# Altium footprint library Footprints_SOC.PcbLib: 194 footprints (part 12 of 13)
Each footprint in its own frame and in the unit in brackets; x right, y up, seen from the top. Pads: shape width x height; smd on the part's side, far side on the other; paste and mask are expansions set on the pad; w line width, h text height; cw(c..) or ccw(c..) is an arc to the next point about the centre after c.
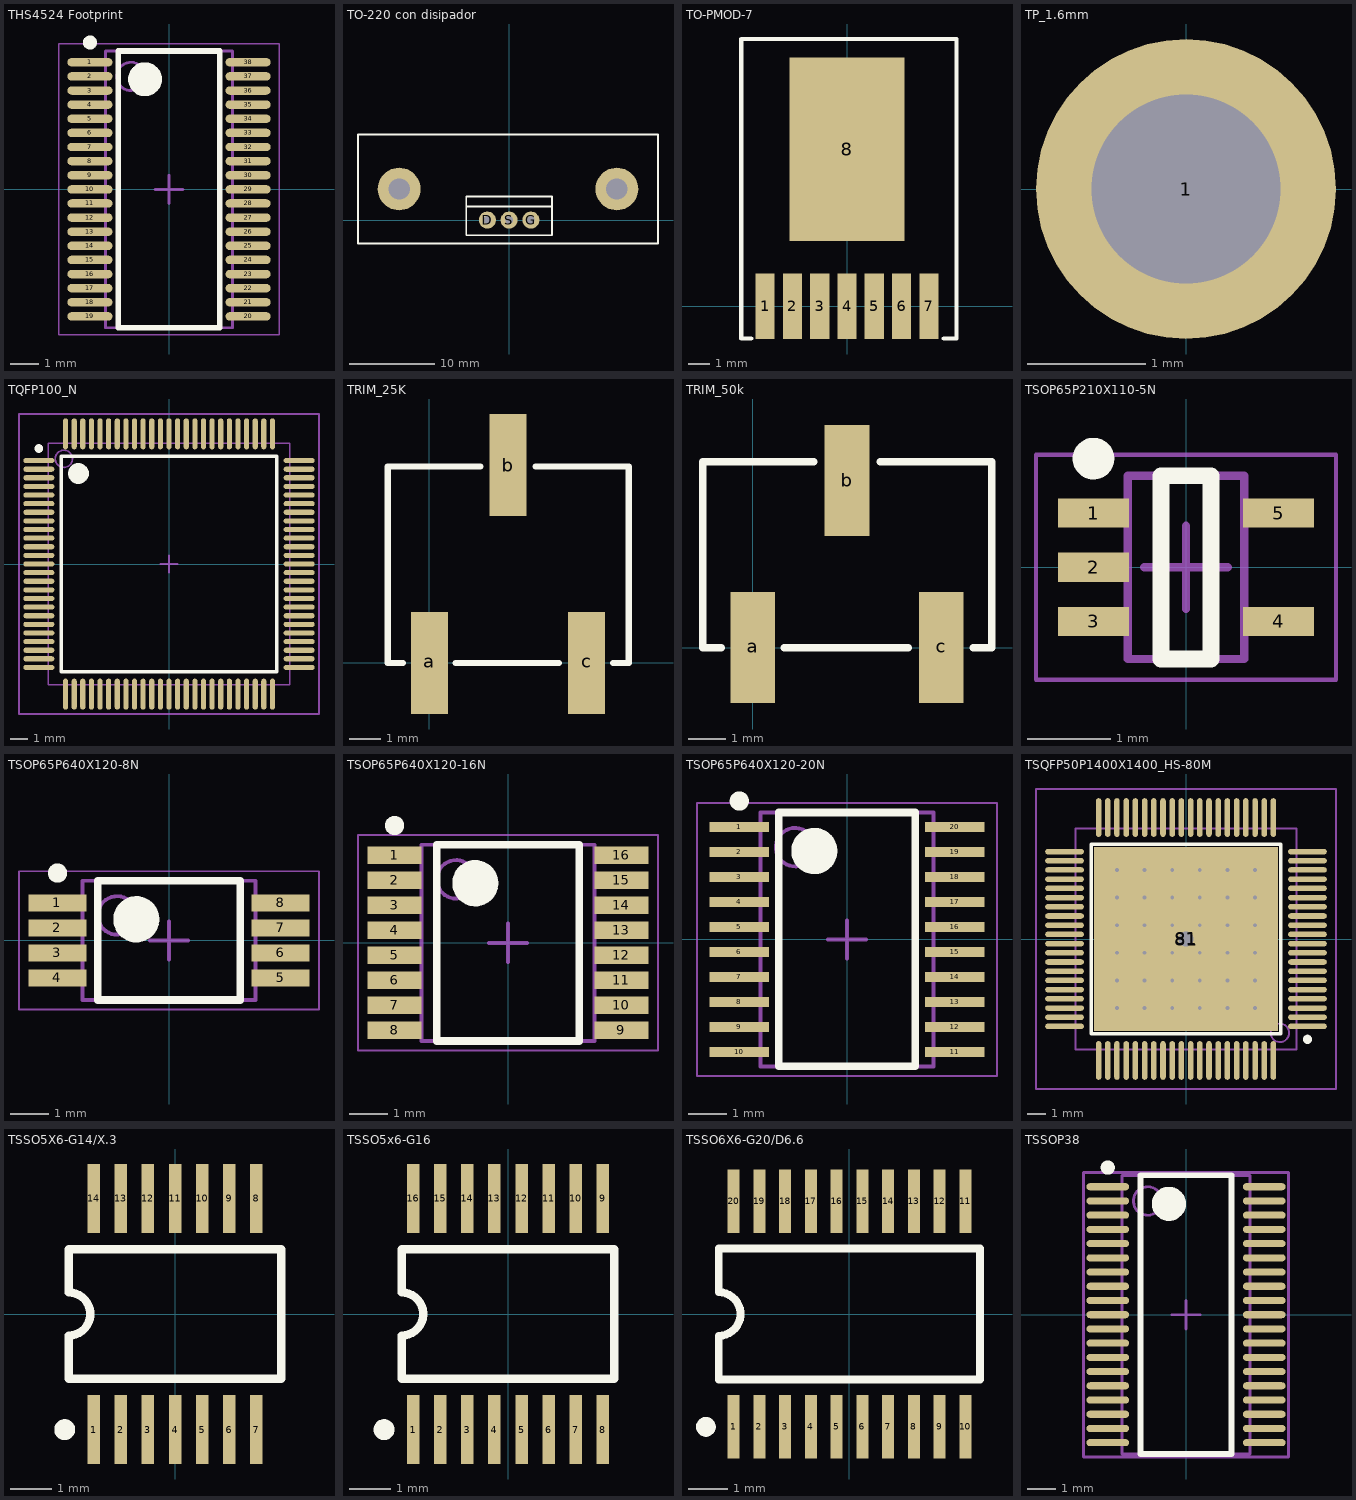
[diagram p11: the footprints below, top view; thin cyan lines are the x and y axes]

## THS4524 Footprint [mm] "THS4524 4Ch Dif Amp, TSSOP"
height 1.2
pads (38):
  oval 1.6x0.3 smd mask+0.05: 1(-2.8,4.5) 2(-2.8,4) 3(-2.8,3.5) 4(-2.8,3) 5(-2.8,2.5) 6(-2.8,2) 7(-2.8,1.5) 8(-2.8,1) 9(-2.8,0.5) 10(-2.8,0) 11(-2.8,-0.5) 12(-2.8,-1) 13(-2.8,-1.5) 14(-2.8,-2) 15(-2.8,-2.5) 16(-2.8,-3) 17(-2.8,-3.5) 18(-2.8,-4) 19(-2.8,-4.5) 20(2.8,-4.5) 21(2.8,-4) 22(2.8,-3.5) 23(2.8,-3) 24(2.8,-2.5) 25(2.8,-2) 26(2.8,-1.5) 27(2.8,-1) 28(2.8,-0.5) 29(2.8,0) 30(2.8,0.5) 31(2.8,1) 32(2.8,1.5) 33(2.8,2) 34(2.8,2.5) 35(2.8,3) 36(2.8,3.5) 37(2.8,4) 38(2.8,4.5)
Top Overlay:
  circle w0.25: c-2.8,5.2 r0.125
  circle w0.6: c-0.85,3.9 r0.3
  lines w0.2: -1.803,-4.9 -1.803,4.9 1.803,4.9 1.803,-4.9 -1.803,-4.9
Mechanical 5:
  circle w0.1: c-1.35,4 r0.5
  lines w0.1: -2.25,-4.9 2.25,-4.9 2.25,4.9 -2.25,4.9 -2.25,-4.9
  text ".Designator" at 0,0 h1.02
Mechanical 15:
  lines w0.05: -3.9,-5.15 -3.9,5.15 3.9,5.15 3.9,-5.15 -3.9,-5.15
  lines w0.1: -0.5,0 0.5,0 ; 0,-0.5 0,0.5
3D body: height 1.2, standoff 0.05, extent -2.25,-4.9 2.25,4.9

## TO-220 con disipador [mm]
pads (5):
  round 2 hole 0.9: D(-2.54,0) G(2.54,0) S(0,0)
  round 5 hole 2.5: ""(-12.829,3.625) ""(12.571,3.625)
Top Overlay:
  lines w0.2: -17.629,9.964 -17.629,-2.725 17.369,-2.725 17.369,9.974 -17.629,9.974 ; -4.999,1.575 5.001,1.575 ; -5,-1.76 5,-1.76 5,2.758 -5,2.758 -5,-1.76
3D body "Disipador TO-220 (CUI_HSE-B20254-035H-02).step": height 25.4, standoff -3.5, extent -17.629,-2.725 17.369,9.974
3D body "TO-220 Vertical.step": height 21.04, standoff 0.31, extent -5,-1.76 5,2.758

## TO-PMOD-7 [mm]
pads (8):
  rect 0.89x3.06 smd: 1(-3.81,0) 2(-2.54,0) 3(-1.27,0) 4(0,0) 5(1.27,0) 6(2.54,0) 7(3.81,0)
  rect 5.35x8.54 smd: 8(0,7.305)
Top Overlay:
  lines w0.2: -4.46,-1.51 -4.92,-1.51 -4.92,12.44 5.1,12.44 5.1,-1.51 4.5,-1.51
3D body "TO-PMOD-7.step": height 4.57, standoff 0, extent -5.06,-1.388 5.1,12.388

## TP_1.6mm [mm]
pads (1):
  round 2.54 hole 1.6: 1(0,0)
Top Overlay:
  text ".Comment" at 1.778,-0.485 h2.54
3D body "User Library-testpoint.STEP": height 5.74, standoff -3.13, extent -1.587,-1.662 1.587,1.513

## TQFP100_N [mm] "Thin QFP, 100-Leads, Body 14x14mm, Pitch 0.5mm, IPC Medium Density"
height 1.2
pads (100):
  oval 1.8x0.3 smd: 1(-7.55,6) 2(-7.55,5.5) 3(-7.55,5) 4(-7.55,4.5) 5(-7.55,4) 6(-7.55,3.5) 7(-7.55,3) 8(-7.55,2.5) 9(-7.55,2) 10(-7.55,1.5) 11(-7.55,1) 12(-7.55,0.5) 13(-7.55,0) 14(-7.55,-0.5) 15(-7.55,-1) 16(-7.55,-1.5) 17(-7.55,-2) 18(-7.55,-2.5) 19(-7.55,-3) 20(-7.55,-3.5) 21(-7.55,-4) 22(-7.55,-4.5) 23(-7.55,-5) 24(-7.55,-5.5) 25(-7.55,-6) 51(7.55,-6) 52(7.55,-5.5) 53(7.55,-5) 54(7.55,-4.5) 55(7.55,-4) 56(7.55,-3.5) 57(7.55,-3) 58(7.55,-2.5) 59(7.55,-2) 60(7.55,-1.5) 61(7.55,-1) 62(7.55,-0.5) 63(7.55,0) 64(7.55,0.5) 65(7.55,1) 66(7.55,1.5) 67(7.55,2) 68(7.55,2.5) 69(7.55,3) 70(7.55,3.5) 71(7.55,4) 72(7.55,4.5) 73(7.55,5) 74(7.55,5.5) 75(7.55,6)
  oval 0.3x1.8 smd: 26(-6,-7.55) 27(-5.5,-7.55) 28(-5,-7.55) 29(-4.5,-7.55) 30(-4,-7.55) 31(-3.5,-7.55) 32(-3,-7.55) 33(-2.5,-7.55) 34(-2,-7.55) 35(-1.5,-7.55) 36(-1,-7.55) 37(-0.5,-7.55) 38(0,-7.55) 39(0.5,-7.55) 40(1,-7.55) 41(1.5,-7.55) 42(2,-7.55) 43(2.5,-7.55) 44(3,-7.55) 45(3.5,-7.55) 46(4,-7.55) 47(4.5,-7.55) 48(5,-7.55) 49(5.5,-7.55) 50(6,-7.55) 76(6,7.55) 77(5.5,7.55) 78(5,7.55) 79(4.5,7.55) 80(4,7.55) 81(3.5,7.55) 82(3,7.55) 83(2.5,7.55) 84(2,7.55) 85(1.5,7.55) 86(1,7.55) 87(0.5,7.55) 88(0,7.55) 89(-0.5,7.55) 90(-1,7.55) 91(-1.5,7.55) 92(-2,7.55) 93(-2.5,7.55) 94(-3,7.55) 95(-3.5,7.55) 96(-4,7.55) 97(-4.5,7.55) 98(-5,7.55) 99(-5.5,7.55) 100(-6,7.55)
Top Overlay:
  circle w0.25: c-7.55,6.7 r0.125
  circle w0.6: c-5.25,5.25 r0.3
  lines w0.2: -6.25,-6.25 -6.25,6.25 6.25,6.25 6.25,-6.25 -6.25,-6.25
Mechanical 13:
  circle w0.1: c-6.1,6.1 r0.5
  lines w0.1: -7,-7 -7,7 7,7 7,-7 -7,-7
Mechanical 15:
  lines w0.1: -0.5,0 0.5,0 ; 0,-0.5 0,0.5 ; -8.7,-8.7 -8.7,8.7 8.7,8.7 8.7,-8.7 -8.7,-8.7
3D body "TQFP 100.stp": height 1.1, standoff 0, extent -8.011,-8.011 8.011,8.011

## TRIM_25K [mm] "3361P-1-253GLFCT-ND"
pads (3):
  rect 1.2x3.3 smd: a(0,0) b(2.54,6.4) c(5.08,0)
Top Overlay:
  lines w0.2: -0.85,0 -1.35,0 -1.35,6.35 1.651,6.35 ; 0.85,0 4.191,0 ; 3.429,6.35 6.444,6.35 6.444,0 5.944,0
3D body: height 2.7, standoff 0, extent -1.397,0 6.35,6.35

## TRIM_50k [mm] "Vishay Series TS63"
pads (3):
  rect 1.2x3 smd: a(0,0) b(2.54,4.5) c(5.08,0)
Top Overlay:
  lines w0.2: -0.85,0 -1.35,0 -1.35,5 1.651,5 ; 0.85,0 4.191,0 ; 3.429,5 6.444,5 6.444,0 5.944,0

## TSOP65P210X110-5N [mm] "TSOP, 5-Leads, Body 2,00x1,25mm, Pitch 0,65mm, IPC Medium Density"
height 1.1
pads (5):
  rect 0.85x0.35 smd: 1(-1.11,0.65) 2(-1.11,0) 3(-1.11,-0.65) 4(1.11,-0.65) 5(1.11,0.65)
Top Overlay:
  circle w0.25: c-1.11,1.304 r0.125
  lines w0.2: -0.3,-1.1 0.3,-1.1 0.3,1.1 -0.3,1.1 -0.3,-1.1
Mechanical 13:
  lines w0.1: -0.7,-1.1 0.7,-1.1 0.7,1.1 -0.7,1.1 -0.7,-1.1
Mechanical 15:
  lines w0.05: -1.8,-1.35 1.8,-1.35 1.8,1.35 -1.8,1.35 -1.8,-1.35
  lines w0.1: -0.5,0 0.5,0 ; 0,-0.5 0,0.5
3D body: height 1.1, standoff 0.1, extent -0.7,-1.1 0.7,1.1

## TSOP65P640X120-8N [mm] "TSOP, 8-Leads, Body 3,00x4,40mm, Pitch 0,65mm, IPC Medium Density"
height 1.2
pads (8):
  rect 1.5x0.45 smd: 1(-2.9,0.975) 2(-2.9,0.325) 3(-2.9,-0.325) 4(-2.9,-0.975) 5(2.9,-0.975) 6(2.9,-0.325) 7(2.9,0.325) 8(2.9,0.975)
Top Overlay:
  circle w0.6: c-0.85,0.55 r0.3
  circle w0.25: c-2.9,1.75 r0.125
  lines w0.2: -1.85,-1.55 1.85,-1.55 1.85,1.55 -1.85,1.55 -1.85,-1.55
Mechanical 5:
  circle w0.1: c-1.35,0.65 r0.5
  lines w0.1: -2.25,-1.55 -2.25,1.55 2.25,1.55 2.25,-1.55 -2.25,-1.55
  text ".Designator" at -1.27,0.127 h1.52
Mechanical 15:
  lines w0.05: -3.9,-1.8 3.9,-1.8 3.9,1.8 -3.9,1.8 -3.9,-1.8
  lines w0.1: -0.5,0 0.5,0 ; 0,-0.5 0,0.5
3D body "User Library-TSSOP-8.STEP": height 1.2, standoff 0, extent -3.2,-1.5 3.2,1.5

## TSOP65P640X120-16N [mm] "TSOP, 16-Leads, Body 5,00x4,40mm, Pitch 0,65mm, IPC Medium Density"
height 1.2
pads (16):
  rect 1.4x0.45 smd: 1(-2.95,2.275) 2(-2.95,1.625) 3(-2.95,0.975) 4(-2.95,0.325) 5(-2.95,-0.325) 6(-2.95,-0.975) 7(-2.95,-1.625) 8(-2.95,-2.275) 9(2.95,-2.275) 10(2.95,-1.625) 11(2.95,-0.975) 12(2.95,-0.325) 13(2.95,0.325) 14(2.95,0.975) 15(2.95,1.625) 16(2.95,2.275)
Top Overlay:
  circle w0.6: c-0.85,1.55 r0.3
  circle w0.25: c-2.95,3.05 r0.125
  lines w0.2: -1.85,-2.55 1.85,-2.55 1.85,2.55 -1.85,2.55 -1.85,-2.55
Mechanical 5:
  circle w0.1: c-1.35,1.65 r0.5
  lines w0.1: -2.25,-2.55 -2.25,2.55 2.25,2.55 2.25,-2.55 -2.25,-2.55
  text ".Designator" at -0.762,2.032 h1.52
Mechanical 15:
  lines w0.05: -3.9,-2.8 3.9,-2.8 3.9,2.8 -3.9,2.8 -3.9,-2.8
  lines w0.1: -0.5,0 0.5,0 ; 0,-0.5 0,0.5
3D body "User Library-TSSOP-16-1.STEP": height 1.1, standoff 0, extent -3.2,-2.5 3.2,2.5

## TSOP65P640X120-20N [mm] "TSOP, 20-Leads, Body 6,50x4,40mm, Pitch 0,65mm, IPC Medium Density"
height 1.2
pads (20):
  rect 1.55x0.25 smd: 1(-2.8,2.925) 2(-2.8,2.275) 3(-2.8,1.625) 4(-2.8,0.975) 5(-2.8,0.325) 6(-2.8,-0.325) 7(-2.8,-0.975) 8(-2.8,-1.625) 9(-2.8,-2.275) 10(-2.8,-2.925) 11(2.8,-2.925) 12(2.8,-2.275) 13(2.8,-1.625) 14(2.8,-0.975) 15(2.8,-0.325) 16(2.8,0.325) 17(2.8,0.975) 18(2.8,1.625) 19(2.8,2.275) 20(2.8,2.925)
Top Overlay:
  circle w0.6: c-0.85,2.3 r0.3
  circle w0.25: c-2.8,3.6 r0.125
  lines w0.2: -1.778,-3.3 1.778,-3.3 1.778,3.3 -1.778,3.3 -1.778,-3.3
Mechanical 5:
  circle w0.1: c-1.35,2.4 r0.5
  lines w0.1: -2.25,-3.3 2.25,-3.3 2.25,3.3 -2.25,3.3 -2.25,-3.3
  text ".Designator" at 0,2.794 h1.52
Mechanical 15:
  lines w0.05: -3.9,-3.55 3.9,-3.55 3.9,3.55 -3.9,3.55 -3.9,-3.55
  lines w0.1: -0.5,0 0.5,0 ; 0,-0.5 0,0.5
3D body "User Library-tssop-20-1.STEP": height 1.2, standoff 0, extent -3.3,-3.3 3.3,3.3

## TSQFP50P1400X1400_HS-80M [mm] "80-Pin Plastic Quad Flat Pack PowerPAD"
height 1.2
pads (82):
  oval 2.1x0.3 smd: 1(6.6,-4.75) 2(6.6,-4.25) 3(6.6,-3.75) 4(6.6,-3.25) 5(6.6,-2.75) 6(6.6,-2.25) 7(6.6,-1.75) 8(6.6,-1.25) 9(6.6,-0.75) 10(6.6,-0.25) 11(6.6,0.25) 12(6.6,0.75) 13(6.6,1.25) 14(6.6,1.75) 15(6.6,2.25) 16(6.6,2.75) 17(6.6,3.25) 18(6.6,3.75) 19(6.6,4.25) 20(6.6,4.75) 41(-6.6,4.75) 42(-6.6,4.25) 43(-6.6,3.75) 44(-6.6,3.25) 45(-6.6,2.75) 46(-6.6,2.25) 47(-6.6,1.75) 48(-6.6,1.25) 49(-6.6,0.75) 50(-6.6,0.25) 51(-6.6,-0.25) 52(-6.6,-0.75) 53(-6.6,-1.25) 54(-6.6,-1.75) 55(-6.6,-2.25) 56(-6.6,-2.75) 57(-6.6,-3.25) 58(-6.6,-3.75) 59(-6.6,-4.25) 60(-6.6,-4.75)
  oval 0.3x2.1 smd: 21(4.75,6.6) 22(4.25,6.6) 23(3.75,6.6) 24(3.25,6.6) 25(2.75,6.6) 26(2.25,6.6) 27(1.75,6.6) 28(1.25,6.6) 29(0.75,6.6) 30(0.25,6.6) 31(-0.25,6.6) 32(-0.75,6.6) 33(-1.25,6.6) 34(-1.75,6.6) 35(-2.25,6.6) 36(-2.75,6.6) 37(-3.25,6.6) 38(-3.75,6.6) 39(-4.25,6.6) 40(-4.75,6.6) 61(-4.75,-6.6) 62(-4.25,-6.6) 63(-3.75,-6.6) 64(-3.25,-6.6) 65(-2.75,-6.6) 66(-2.25,-6.6) 67(-1.75,-6.6) 68(-1.25,-6.6) 69(-0.75,-6.6) 70(-0.25,-6.6) 71(0.25,-6.6) 72(0.75,-6.6) 73(1.25,-6.6) 74(1.75,-6.6) 75(2.25,-6.6) 76(2.75,-6.6) 77(3.25,-6.6) 78(3.75,-6.6) 79(4.25,-6.6) 80(4.75,-6.6)
  rect 10x10 smd mask-1.9: 81(0,0)
  round 1.5 hole 0.8: 81(0,0)
via 0.75,3.75 diameter 0.45 hole 0.2
via 2.25,3.75 diameter 0.45 hole 0.2
via 3.75,3.75 diameter 0.45 hole 0.2
via -0.75,3.75 diameter 0.45 hole 0.2
via -2.25,3.75 diameter 0.45 hole 0.2
via -3.75,3.75 diameter 0.45 hole 0.2
via 0.75,2.25 diameter 0.45 hole 0.2
via 2.25,2.25 diameter 0.45 hole 0.2
via 3.75,2.25 diameter 0.45 hole 0.2
via -0.75,2.25 diameter 0.45 hole 0.2
via -2.25,2.25 diameter 0.45 hole 0.2
via -3.75,2.25 diameter 0.45 hole 0.2
via 0.75,0.75 diameter 0.45 hole 0.2
via 2.25,0.75 diameter 0.45 hole 0.2
via 3.75,0.75 diameter 0.45 hole 0.2
via -2.25,0.75 diameter 0.45 hole 0.2
via -3.75,0.75 diameter 0.45 hole 0.2
via 0.75,-3.75 diameter 0.45 hole 0.2
via 2.25,-3.75 diameter 0.45 hole 0.2
via 3.75,-3.75 diameter 0.45 hole 0.2
via -0.75,-3.75 diameter 0.45 hole 0.2
via -2.25,-3.75 diameter 0.45 hole 0.2
via -3.75,-3.75 diameter 0.45 hole 0.2
via 0.75,-2.25 diameter 0.45 hole 0.2
via 2.25,-2.25 diameter 0.45 hole 0.2
via 3.75,-2.25 diameter 0.45 hole 0.2
via -0.75,-2.25 diameter 0.45 hole 0.2
via -2.25,-2.25 diameter 0.45 hole 0.2
via -3.75,-2.25 diameter 0.45 hole 0.2
via 0.75,-0.75 diameter 0.45 hole 0.2
via 2.25,-0.75 diameter 0.45 hole 0.2
via 3.75,-0.75 diameter 0.45 hole 0.2
via -0.75,-0.75 diameter 0.45 hole 0.2
via -2.25,-0.75 diameter 0.45 hole 0.2
via -3.75,-0.75 diameter 0.45 hole 0.2
via -0.75,0.75 diameter 0.45 hole 0.2
Top Overlay:
  circle w0.25: c6.6,-5.45 r0.125
  lines w0.2: -5.15,-5.15 -5.15,5.15 5.15,5.15 5.15,-5.15 -5.15,-5.15
Mechanical 13:
  circle w0.1: c5.1,-5.1 r0.5
  lines w0.1: -6,-6 -6,6 6,6 6,-6 -6,-6
Mechanical 15:
  lines w0.1: -0.5,0 0.5,0 ; 0,-0.5 0,0.5 ; -8.15,-8.15 -8.15,8.15 8.15,8.15 8.15,-8.15 -8.15,-8.15
3D body: height 1.2, standoff 0, extent -6,-6 6,6

## TSSO5X6-G14/X.3 [mm] "Shrink Small Outline, TSSOP; 14 Leads; Body Width 4.4 mm; Pitch 0.65 mm"
height 1.2
pads (14):
  rect 0.3x1.65 smd: 1(-1.95,-2.775) 2(-1.3,-2.775) 3(-0.65,-2.775) 4(0,-2.775) 5(0.65,-2.775) 6(1.3,-2.775) 7(1.95,-2.775) 8(1.95,2.775) 9(1.3,2.775) 10(0.65,2.775) 11(0,2.775) 12(-0.65,2.775) 13(-1.3,2.775) 14(-1.95,2.775)
Top Overlay:
  circle w0.25: c-2.65,-2.775 r0.125
  lines w0.2: -2.55,-1.55 2.55,-1.55 2.55,1.55 -2.55,1.55 -2.55,0.517 cw(c-2.55,0) -2.55,-0.517 -2.55,-1.55
3D body "tssop_14.step": height 1.16, standoff -0.06, extent -2.5,-3.215 2.5,3.187

## TSSO5x6-G16 [mm] "Shrink Small Outline; 16 Leads; Body Width 4.4 mm; Pitch 0.65 mm"
height 1.1
pads (16):
  rect 0.3x1.65 smd: 1(-2.275,-2.775) 2(-1.625,-2.775) 3(-0.975,-2.775) 4(-0.325,-2.775) 5(0.325,-2.775) 6(0.975,-2.775) 7(1.625,-2.775) 8(2.275,-2.775) 9(2.275,2.775) 10(1.625,2.775) 11(0.975,2.775) 12(0.325,2.775) 13(-0.325,2.775) 14(-0.975,2.775) 15(-1.625,2.775) 16(-2.275,2.775)
Top Overlay:
  circle w0.25: c-2.975,-2.775 r0.125
  lines w0.2: -2.55,-1.55 2.55,-1.55 2.55,1.55 -2.55,1.55 -2.55,0.517 cw(c-2.55,0) -2.55,-0.517 -2.55,-1.55
3D body "TSSOP16.stp": height 1.11, standoff 0.01, extent -2.554,-3.217 2.548,3.213

## TSSO6X6-G20/D6.6 [mm] "Shrink Small Outline; 20 Leads; Body Width 4.4 mm; Pitch 0.65 mm"
height 1.1
pads (20):
  rect 0.3x1.6 smd: 1(-2.925,-2.85) 2(-2.275,-2.85) 3(-1.625,-2.85) 4(-0.975,-2.85) 5(-0.325,-2.85) 6(0.325,-2.85) 7(0.975,-2.85) 8(1.625,-2.85) 9(2.275,-2.85) 10(2.925,-2.85) 11(2.925,2.85) 12(2.275,2.85) 13(1.625,2.85) 14(0.975,2.85) 15(0.325,2.85) 16(-0.325,2.85) 17(-0.975,2.85) 18(-1.625,2.85) 19(-2.275,2.85) 20(-2.925,2.85)
Top Overlay:
  circle w0.25: c-3.625,-2.85 r0.125
  lines w0.2: -3.3,-1.65 -3.3,-0.55 ccw(c-3.3,0) -3.3,0.55 -3.3,1.65 3.3,1.65 3.3,-1.65 -3.3,-1.65
3D body "User Library-tssop-20-1.STEP": height 1.2, standoff 0, extent -3.304,-3.29 3.296,3.31

## TSSOP38 [mm]
pads (38):
  oval 1.5x0.25 smd: 1(-2.75,4.5) 2(-2.75,4) 3(-2.75,3.5) 4(-2.75,3) 5(-2.75,2.5) 6(-2.75,2) 7(-2.75,1.5) 8(-2.75,1) 9(-2.75,0.5) 10(-2.75,0) 11(-2.75,-0.5) 12(-2.75,-1) 13(-2.75,-1.5) 14(-2.75,-2) 15(-2.75,-2.5) 16(-2.75,-3) 17(-2.75,-3.5) 18(-2.75,-4) 19(-2.75,-4.5) 20(2.75,-4.5) 21(2.75,-4) 22(2.75,-3.5) 23(2.75,-3) 24(2.75,-2.5) 25(2.75,-2) 26(2.75,-1.5) 27(2.75,-1) 28(2.75,-0.5) 29(2.75,0) 30(2.75,0.5) 31(2.75,1) 32(2.75,1.5) 33(2.75,2) 34(2.75,2.5) 35(2.75,3) 36(2.75,3.5) 37(2.75,4) 38(2.75,4.5)
Top Overlay:
  circle w0.6: c-0.6,3.9 r0.3
  circle w0.25: c-2.75,5.175 r0.125
  lines w0.2: -1.6,-4.9 1.6,-4.9 1.6,4.9 -1.6,4.9 -1.6,-4.9
Mechanical 13:
  circle w0.1: c-1.35,4 r0.5
  lines w0.1: -2.25,-4.9 2.25,-4.9 2.25,4.9 -2.25,4.9 -2.25,-4.9
Mechanical 15:
  lines w0.1: -0.5,0 0.5,0 ; 0,-0.5 0,0.5 ; -3.6,-5 3.6,-5 3.6,5 -3.6,5 -3.6,-5
3D body: height 1.2, standoff 0, extent -2.25,-4.9 2.25,4.9